# Altium footprint library 我的器件.PCBLIB: 450 footprints (part 14 of 29)
Each footprint in its own frame and in the unit in brackets; x right, y up, seen from the top. Pads: shape width x height; smd on the part's side, far side on the other; paste and mask are expansions set on the pad; w line width, h text height; cw(c..) or ccw(c..) is an arc to the next point about the centre after c.
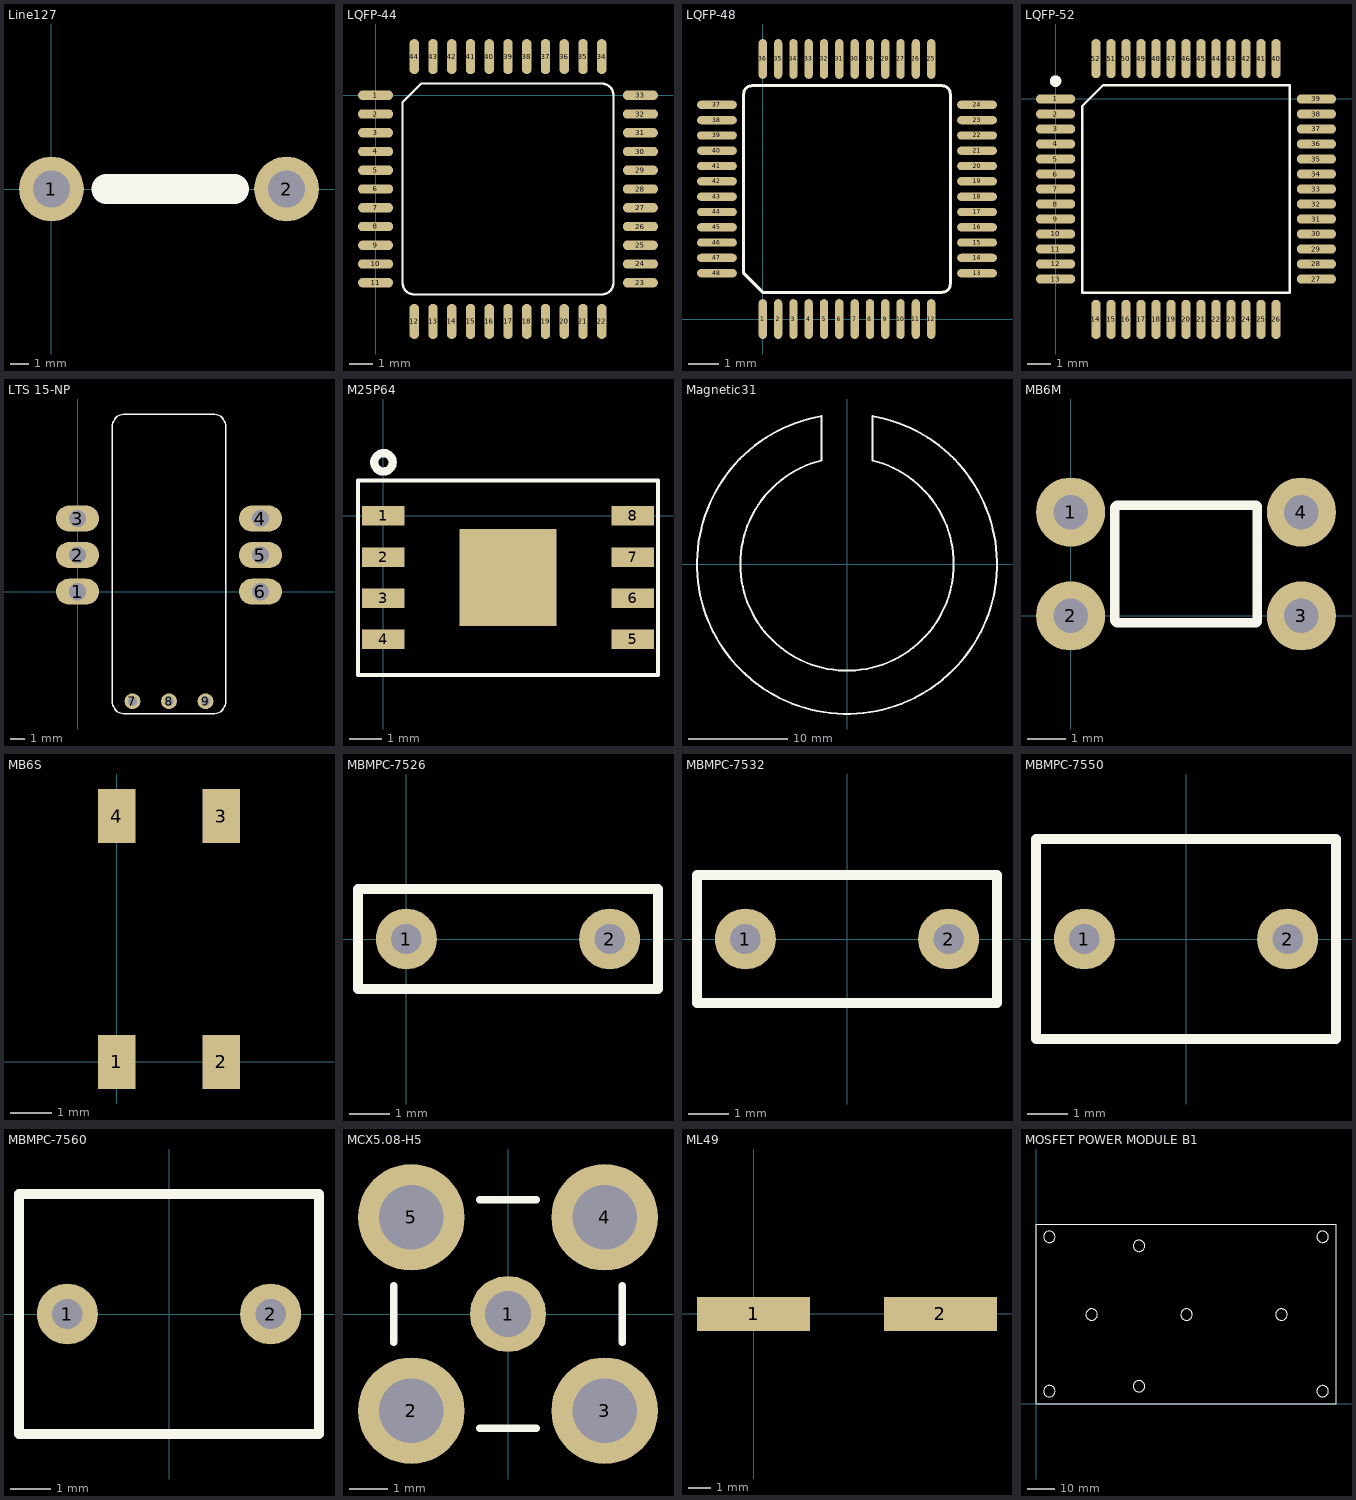
[diagram p13: the footprints below, top view; thin cyan lines are the x and y axes]

## Line127 [mm]
pads (2):
  round 3.5 hole 2: 1(0,0) 2(12.7,0)
Top Overlay:
  lines w1.6: 2.971,0 9.875,0

## LQFP-44 [mm] "Body 12mmX12mmX1.2mm"
height 1.2
pads (44):
  oval 1.5x0.4 smd: 1(0,0) 2(0,-0.8) 3(0,-1.6) 4(0,-2.4) 5(0,-3.2) 6(0,-4) 7(0,-4.8) 8(0,-5.6) 9(0,-6.4) 10(0,-7.2) 11(0,-8) 23(11.303,-8.001) 24(11.303,-7.201) 25(11.303,-6.401) 26(11.303,-5.601) 27(11.303,-4.801) 28(11.303,-4.001) 29(11.303,-3.201) 30(11.303,-2.401) 31(11.303,-1.601) 32(11.303,-0.801) 33(11.303,-0.001)
  oval 0.4x1.5 smd: 12(1.652,-9.652) 13(2.452,-9.652) 14(3.252,-9.652) 15(4.052,-9.652) 16(4.852,-9.652) 17(5.652,-9.652) 18(6.452,-9.652) 19(7.252,-9.652) 20(8.052,-9.652) 21(8.852,-9.652) 22(9.652,-9.652) 34(9.652,1.651) 35(8.852,1.651) 36(8.052,1.651) 37(7.252,1.651) 38(6.452,1.651) 39(5.652,1.651) 40(4.852,1.651) 41(4.052,1.651) 42(3.252,1.651) 43(2.452,1.651) 44(1.652,1.651)
Top Overlay:
  lines w0.1: 1.652,-8.501 9.651,-8.501 ccw(c9.651,-8.001) 10.152,-8.001 ; 1.652,-8.501 cw(c1.652,-8) 1.151,-8 1.151,-0.3 1.951,0.5 9.652,0.5 cw(c9.652,-0.001) 10.152,-0.001 10.152,-8
3D body: height 2.11, standoff 0.1, extent 1.5,-0.9 2.695,0.298
3D body: height 2, standoff 0.5, extent 0.749,-8.903 10.554,0.9
3D body: height 1.4, standoff 1.2, extent 1.464,0.902 1.841,1.156
3D body: height 1.4, standoff 0, extent 1.464,1.156 1.841,1.359
3D body: height 0.3, standoff 0, extent 1.464,1.359 1.841,2.045
3D body: height 0.3, standoff 0, extent 2.264,1.359 2.642,2.045
3D body: height 1.4, standoff 0, extent 2.264,1.156 2.642,1.359
3D body: height 1.4, standoff 1.2, extent 2.264,0.902 2.642,1.156
3D body: height 0.3, standoff 0, extent 3.064,1.359 3.442,2.045
3D body: height 1.4, standoff 0, extent 3.064,1.156 3.442,1.359
3D body: height 1.4, standoff 1.2, extent 3.064,0.902 3.442,1.156
3D body: height 0.3, standoff 0, extent 3.864,1.359 4.242,2.045
3D body: height 1.4, standoff 0, extent 3.864,1.156 4.242,1.359
3D body: height 1.4, standoff 1.2, extent 3.864,0.902 4.242,1.156
3D body: height 0.3, standoff 0, extent 4.664,1.359 5.042,2.045
3D body: height 1.4, standoff 0, extent 4.664,1.156 5.042,1.359
3D body: height 1.4, standoff 1.2, extent 4.664,0.902 5.042,1.156
3D body: height 0.3, standoff 0, extent 5.464,1.359 5.842,2.045
3D body: height 1.4, standoff 0, extent 5.464,1.156 5.842,1.359
3D body: height 1.4, standoff 1.2, extent 5.464,0.902 5.842,1.156
3D body: height 0.3, standoff 0, extent 6.264,1.359 6.642,2.045
3D body: height 1.4, standoff 0, extent 6.264,1.156 6.642,1.359
3D body: height 1.4, standoff 1.2, extent 6.264,0.902 6.642,1.156
3D body: height 0.3, standoff 0, extent 7.064,1.359 7.442,2.045
3D body: height 1.4, standoff 0, extent 7.064,1.156 7.442,1.359
3D body: height 1.4, standoff 1.2, extent 7.064,0.902 7.442,1.156
3D body: height 0.3, standoff 0, extent 7.876,1.372 8.254,2.057
3D body: height 1.4, standoff 0, extent 7.876,1.168 8.254,1.372
3D body: height 1.4, standoff 1.2, extent 7.876,0.914 8.254,1.168
3D body: height 0.3, standoff 0, extent 8.664,1.359 9.042,2.045
3D body: height 1.4, standoff 0, extent 8.664,1.156 9.042,1.359
3D body: height 1.4, standoff 1.2, extent 8.664,0.902 9.042,1.156
3D body: height 0.3, standoff 0, extent 9.464,1.359 9.842,2.045
3D body: height 1.4, standoff 0, extent 9.464,1.156 9.842,1.359
3D body: height 1.4, standoff 1.2, extent 9.464,0.902 9.842,1.156
3D body: height 0.3, standoff 0, extent 11.011,-0.191 11.697,0.187
3D body: height 1.4, standoff 0, extent 10.808,-0.191 11.011,0.187
3D body: height 1.4, standoff 1.2, extent 10.554,-0.191 10.808,0.187
3D body: height 0.3, standoff 0, extent 11.011,-0.991 11.697,-0.613
3D body: height 1.4, standoff 0, extent 10.808,-0.991 11.011,-0.613
3D body: height 1.4, standoff 1.2, extent 10.554,-0.991 10.808,-0.613
3D body: height 0.3, standoff 0, extent 11.011,-1.791 11.697,-1.413
3D body: height 1.4, standoff 0, extent 10.808,-1.791 11.011,-1.413
3D body: height 1.4, standoff 1.2, extent 10.554,-1.791 10.808,-1.413
3D body: height 0.3, standoff 0, extent 11.011,-2.591 11.697,-2.213
3D body: height 1.4, standoff 0, extent 10.808,-2.591 11.011,-2.213
3D body: height 1.4, standoff 1.2, extent 10.554,-2.591 10.808,-2.213
3D body: height 0.3, standoff 0, extent 11.011,-3.391 11.697,-3.013
3D body: height 1.4, standoff 0, extent 10.808,-3.391 11.011,-3.013
3D body: height 1.4, standoff 1.2, extent 10.554,-3.391 10.808,-3.013
3D body: height 0.3, standoff 0, extent 11.011,-4.191 11.697,-3.813
3D body: height 1.4, standoff 0, extent 10.808,-4.191 11.011,-3.813
3D body: height 1.4, standoff 1.2, extent 10.554,-4.191 10.808,-3.813
3D body: height 0.3, standoff 0, extent 11.011,-4.991 11.697,-4.613
3D body: height 1.4, standoff 0, extent 10.808,-4.991 11.011,-4.613
3D body: height 1.4, standoff 1.2, extent 10.554,-4.991 10.808,-4.613
3D body: height 0.3, standoff 0, extent 11.011,-5.791 11.697,-5.413
3D body: height 1.4, standoff 0, extent 10.808,-5.791 11.011,-5.413
3D body: height 1.4, standoff 1.2, extent 10.554,-5.791 10.808,-5.413
3D body: height 0.3, standoff 0, extent 11.011,-6.591 11.697,-6.213
3D body: height 1.4, standoff 0, extent 10.808,-6.591 11.011,-6.213
3D body: height 1.4, standoff 1.2, extent 10.554,-6.591 10.808,-6.213
3D body: height 0.3, standoff 0, extent 11.011,-7.391 11.697,-7.013
3D body: height 1.4, standoff 0, extent 10.808,-7.391 11.011,-7.013
3D body: height 1.4, standoff 1.2, extent 10.554,-7.391 10.808,-7.013
3D body: height 0.3, standoff 0, extent 11.011,-8.191 11.697,-7.813
3D body: height 1.4, standoff 0, extent 10.808,-8.191 11.011,-7.813
3D body: height 1.4, standoff 1.2, extent 10.554,-8.191 10.808,-7.813
3D body: height 0.3, standoff 0, extent 9.462,-10.046 9.84,-9.36
3D body: height 1.4, standoff 0, extent 9.462,-9.36 9.84,-9.157
3D body: height 1.4, standoff 1.2, extent 9.462,-9.157 9.84,-8.903
3D body: height 0.3, standoff 0, extent 8.662,-10.046 9.04,-9.36
3D body: height 1.4, standoff 0, extent 8.662,-9.36 9.04,-9.157
3D body: height 1.4, standoff 1.2, extent 8.662,-9.157 9.04,-8.903
3D body: height 0.3, standoff 0, extent 7.862,-10.046 8.24,-9.36
3D body: height 1.4, standoff 0, extent 7.862,-9.36 8.24,-9.157
3D body: height 1.4, standoff 1.2, extent 7.862,-9.157 8.24,-8.903
3D body: height 0.3, standoff 0, extent 7.062,-10.046 7.44,-9.36
3D body: height 1.4, standoff 0, extent 7.062,-9.36 7.44,-9.157
3D body: height 1.4, standoff 1.2, extent 7.062,-9.157 7.44,-8.903
3D body: height 0.3, standoff 0, extent 6.262,-10.046 6.64,-9.36
3D body: height 1.4, standoff 0, extent 6.262,-9.36 6.64,-9.157
3D body: height 1.4, standoff 1.2, extent 6.262,-9.157 6.64,-8.903
3D body: height 0.3, standoff 0, extent 5.462,-10.046 5.84,-9.36
3D body: height 1.4, standoff 0, extent 5.462,-9.36 5.84,-9.157
3D body: height 1.4, standoff 1.2, extent 5.462,-9.157 5.84,-8.903
3D body: height 0.3, standoff 0, extent 4.662,-10.046 5.04,-9.36
3D body: height 1.4, standoff 0, extent 4.662,-9.36 5.04,-9.157
3D body: height 1.4, standoff 1.2, extent 4.662,-9.157 5.04,-8.903
3D body: height 0.3, standoff 0, extent 3.862,-10.046 4.24,-9.36
3D body: height 1.4, standoff 0, extent 3.862,-9.36 4.24,-9.157
3D body: height 1.4, standoff 1.2, extent 3.862,-9.157 4.24,-8.903
3D body: height 0.3, standoff 0, extent 3.062,-10.046 3.44,-9.36
3D body: height 1.4, standoff 0, extent 3.062,-9.36 3.44,-9.157
3D body: height 1.4, standoff 1.2, extent 3.062,-9.157 3.44,-8.903
3D body: height 0.3, standoff 0, extent 2.262,-10.046 2.64,-9.36
3D body: height 1.4, standoff 0, extent 2.262,-9.36 2.64,-9.157
3D body: height 1.4, standoff 1.2, extent 2.262,-9.157 2.64,-8.903
3D body: height 0.3, standoff 0, extent 1.462,-10.046 1.84,-9.36
3D body: height 1.4, standoff 0, extent 1.462,-9.36 1.84,-9.157
3D body: height 1.4, standoff 1.2, extent 1.462,-9.157 1.84,-8.903
3D body: height 0.3, standoff 0, extent -0.394,-8.188 0.292,-7.81
3D body: height 1.4, standoff 0, extent 0.292,-8.188 0.495,-7.81
3D body: height 1.4, standoff 1.2, extent 0.495,-8.188 0.749,-7.81
3D body: height 0.3, standoff 0, extent -0.394,-7.388 0.292,-7.01
3D body: height 1.4, standoff 0, extent 0.292,-7.388 0.495,-7.01
3D body: height 1.4, standoff 1.2, extent 0.495,-7.388 0.749,-7.01
3D body: height 0.3, standoff 0, extent -0.394,-6.588 0.292,-6.21
3D body: height 1.4, standoff 0, extent 0.292,-6.588 0.495,-6.21
3D body: height 1.4, standoff 1.2, extent 0.495,-6.588 0.749,-6.21
3D body: height 0.3, standoff 0, extent -0.394,-5.788 0.292,-5.41
3D body: height 1.4, standoff 0, extent 0.292,-5.788 0.495,-5.41
3D body: height 1.4, standoff 1.2, extent 0.495,-5.788 0.749,-5.41
3D body: height 0.3, standoff 0, extent -0.394,-4.988 0.292,-4.61
3D body: height 1.4, standoff 0, extent 0.292,-4.988 0.495,-4.61
3D body: height 1.4, standoff 1.2, extent 0.495,-4.988 0.749,-4.61
3D body: height 0.3, standoff 0, extent -0.394,-4.188 0.292,-3.81
3D body: height 1.4, standoff 0, extent 0.292,-4.188 0.495,-3.81
3D body: height 1.4, standoff 1.2, extent 0.495,-4.188 0.749,-3.81
3D body: height 0.3, standoff 0, extent -0.394,-3.388 0.292,-3.01
3D body: height 1.4, standoff 0, extent 0.292,-3.388 0.495,-3.01
3D body: height 1.4, standoff 1.2, extent 0.495,-3.388 0.749,-3.01
3D body: height 0.3, standoff 0, extent -0.394,-2.588 0.292,-2.21
3D body: height 1.4, standoff 0, extent 0.292,-2.588 0.495,-2.21
3D body: height 1.4, standoff 1.2, extent 0.495,-2.588 0.749,-2.21
3D body: height 0.3, standoff 0, extent -0.394,-1.788 0.292,-1.41
3D body: height 1.4, standoff 0, extent 0.292,-1.788 0.495,-1.41
3D body: height 1.4, standoff 1.2, extent 0.495,-1.788 0.749,-1.41
3D body: height 0.3, standoff 0, extent -0.394,-0.988 0.292,-0.61
3D body: height 1.4, standoff 0, extent 0.292,-0.988 0.495,-0.61
3D body: height 1.4, standoff 1.2, extent 0.495,-0.988 0.749,-0.61
3D body: height 0.3, standoff 0, extent -0.394,-0.188 0.292,0.19
3D body: height 1.4, standoff 0, extent 0.292,-0.188 0.495,0.19
3D body: height 1.4, standoff 1.2, extent 0.495,-0.188 0.749,0.19

## LQFP-48 [mm] "distance 0.5mm"
pads (48):
  oval 0.27x1.3 smd: 1(0,0) 2(0.5,0) 3(1,0) 4(1.5,0) 5(2,0) 6(2.5,0) 7(3,0) 8(3.5,0) 9(4,0) 10(4.5,0) 11(5,0) 12(5.5,0) 25(5.5,8.5) 26(5,8.5) 27(4.5,8.5) 28(4,8.5) 29(3.5,8.5) 30(3,8.5) 31(2.5,8.5) 32(2,8.5) 33(1.5,8.5) 34(1,8.5) 35(0.5,8.5) 36(0,8.5)
  oval 1.3x0.27 smd: 13(7,1.5) 14(7,2) 15(7,2.5) 16(7,3) 17(7,3.5) 18(7,4) 19(7,4.5) 20(7,5) 21(7,5.5) 22(7,6) 23(7,6.5) 24(7,7) 37(-1.5,7) 38(-1.5,6.5) 39(-1.5,6) 40(-1.5,5.5) 41(-1.5,5) 42(-1.5,4.5) 43(-1.5,4) 44(-1.5,3.5) 45(-1.5,3) 46(-1.5,2.5) 47(-1.5,2) 48(-1.5,1.5)
Top Overlay:
  lines w0.1: -0.625,1.5 -0.625,7.35 cw(c-0.35,7.35) -0.35,7.625 5.85,7.625 cw(c5.85,7.35) 6.125,7.35 6.125,1.15 cw(c5.85,1.15) 5.85,0.875 0,0.875 -0.625,1.5
3D body: height 1, standoff 0.8, extent -0.127,0.406 0.127,0.66
3D body: height 1, standoff 0, extent -0.127,0.203 0.127,0.406
3D body: height 0.3, standoff 0, extent -0.127,-0.483 0.127,0.203
3D body: height 1.6, standoff 0.1, extent -0.857,0.643 6.382,7.857
3D body: height 1.61, standoff 1.6, extent -0.3,1.2 0.3,1.8
3D body: height 0.3, standoff 0, extent 0.373,-0.483 0.627,0.203
3D body: height 1, standoff 0, extent 0.373,0.203 0.627,0.406
3D body: height 1, standoff 0.8, extent 0.373,0.406 0.627,0.66
3D body: height 0.3, standoff 0, extent 0.873,-0.483 1.127,0.203
3D body: height 1, standoff 0, extent 0.873,0.203 1.127,0.406
3D body: height 1, standoff 0.8, extent 0.873,0.406 1.127,0.66
3D body: height 0.3, standoff 0, extent 1.373,-0.483 1.627,0.203
3D body: height 1, standoff 0, extent 1.373,0.203 1.627,0.406
3D body: height 1, standoff 0.8, extent 1.373,0.406 1.627,0.66
3D body: height 0.3, standoff 0, extent 1.873,-0.483 2.127,0.203
3D body: height 1, standoff 0, extent 1.873,0.203 2.127,0.406
3D body: height 1, standoff 0.8, extent 1.873,0.406 2.127,0.66
3D body: height 0.3, standoff 0, extent 2.373,-0.483 2.627,0.203
3D body: height 1, standoff 0, extent 2.373,0.203 2.627,0.406
3D body: height 1, standoff 0.8, extent 2.373,0.406 2.627,0.66
3D body: height 0.3, standoff 0, extent 2.873,-0.483 3.127,0.203
3D body: height 1, standoff 0, extent 2.873,0.203 3.127,0.406
3D body: height 1, standoff 0.8, extent 2.873,0.406 3.127,0.66
3D body: height 0.3, standoff 0, extent 3.373,-0.483 3.627,0.203
3D body: height 1, standoff 0, extent 3.373,0.203 3.627,0.406
3D body: height 1, standoff 0.8, extent 3.373,0.406 3.627,0.66
3D body: height 0.3, standoff 0, extent 3.873,-0.483 4.127,0.203
3D body: height 1, standoff 0, extent 3.873,0.203 4.127,0.406
3D body: height 1, standoff 0.8, extent 3.873,0.406 4.127,0.66
3D body: height 0.3, standoff 0, extent 4.373,-0.483 4.627,0.203
3D body: height 1, standoff 0, extent 4.373,0.203 4.627,0.406
3D body: height 1, standoff 0.8, extent 4.373,0.406 4.627,0.66
3D body: height 0.3, standoff 0, extent 4.873,-0.483 5.127,0.203
3D body: height 1, standoff 0, extent 4.873,0.203 5.127,0.406
3D body: height 1, standoff 0.8, extent 4.873,0.406 5.127,0.66
3D body: height 0.3, standoff 0, extent 5.373,-0.483 5.627,0.203
3D body: height 1, standoff 0, extent 5.373,0.203 5.627,0.406
3D body: height 1, standoff 0.8, extent 5.373,0.406 5.627,0.66
3D body: height 1, standoff 0.8, extent 6.34,6.873 6.594,7.127
3D body: height 1, standoff 0, extent 6.594,6.873 6.797,7.127
3D body: height 0.3, standoff 0, extent 6.797,6.873 7.483,7.127
3D body: height 1, standoff 0.8, extent 6.34,6.373 6.594,6.627
3D body: height 1, standoff 0, extent 6.594,6.373 6.797,6.627
3D body: height 0.3, standoff 0, extent 6.797,6.373 7.483,6.627
3D body: height 1, standoff 0.8, extent 6.34,5.873 6.594,6.127
3D body: height 1, standoff 0, extent 6.594,5.873 6.797,6.127
3D body: height 0.3, standoff 0, extent 6.797,5.873 7.483,6.127
3D body: height 1, standoff 0.8, extent 6.34,5.373 6.594,5.627
3D body: height 1, standoff 0, extent 6.594,5.373 6.797,5.627
3D body: height 0.3, standoff 0, extent 6.797,5.373 7.483,5.627
3D body: height 1, standoff 0.8, extent 6.34,4.873 6.594,5.127
3D body: height 1, standoff 0, extent 6.594,4.873 6.797,5.127
3D body: height 0.3, standoff 0, extent 6.797,4.873 7.483,5.127
3D body: height 1, standoff 0.8, extent 6.34,4.373 6.594,4.627
3D body: height 1, standoff 0, extent 6.594,4.373 6.797,4.627
3D body: height 0.3, standoff 0, extent 6.797,4.373 7.483,4.627
3D body: height 1, standoff 0.8, extent 6.34,3.873 6.594,4.127
3D body: height 1, standoff 0, extent 6.594,3.873 6.797,4.127
3D body: height 0.3, standoff 0, extent 6.797,3.873 7.483,4.127
3D body: height 1, standoff 0.8, extent 6.34,3.373 6.594,3.627
3D body: height 1, standoff 0, extent 6.594,3.373 6.797,3.627
3D body: height 0.3, standoff 0, extent 6.797,3.373 7.483,3.627
3D body: height 1, standoff 0.8, extent 6.34,2.873 6.594,3.127
3D body: height 1, standoff 0, extent 6.594,2.873 6.797,3.127
3D body: height 0.3, standoff 0, extent 6.797,2.873 7.483,3.127
3D body: height 1, standoff 0.8, extent 6.34,2.373 6.594,2.627
3D body: height 1, standoff 0, extent 6.594,2.373 6.797,2.627
3D body: height 0.3, standoff 0, extent 6.797,2.373 7.483,2.627
3D body: height 1, standoff 0.8, extent 6.34,1.873 6.594,2.127
3D body: height 1, standoff 0, extent 6.594,1.873 6.797,2.127
3D body: height 0.3, standoff 0, extent 6.797,1.873 7.483,2.127
3D body: height 0.3, standoff 0, extent 6.797,1.373 7.483,1.627
3D body: height 1, standoff 0, extent 6.594,1.373 6.797,1.627
3D body: height 1, standoff 0.8, extent 6.34,1.373 6.594,1.627
3D body: height 1, standoff 0.8, extent -0.127,7.84 0.127,8.094
3D body: height 1, standoff 0, extent -0.127,8.094 0.127,8.297
3D body: height 0.3, standoff 0, extent -0.127,8.297 0.127,8.983
3D body: height 1, standoff 0.8, extent 0.373,7.84 0.627,8.094
3D body: height 1, standoff 0, extent 0.373,8.094 0.627,8.297
3D body: height 0.3, standoff 0, extent 0.373,8.297 0.627,8.983
3D body: height 1, standoff 0.8, extent 0.873,7.84 1.127,8.094
3D body: height 1, standoff 0, extent 0.873,8.094 1.127,8.297
3D body: height 0.3, standoff 0, extent 0.873,8.297 1.127,8.983
3D body: height 1, standoff 0.8, extent 1.373,7.84 1.627,8.094
3D body: height 1, standoff 0, extent 1.373,8.094 1.627,8.297
3D body: height 0.3, standoff 0, extent 1.373,8.297 1.627,8.983
3D body: height 1, standoff 0.8, extent 1.873,7.84 2.127,8.094
3D body: height 1, standoff 0, extent 1.873,8.094 2.127,8.297
3D body: height 0.3, standoff 0, extent 1.873,8.297 2.127,8.983
3D body: height 1, standoff 0.8, extent 2.373,7.84 2.627,8.094
3D body: height 1, standoff 0, extent 2.373,8.094 2.627,8.297
3D body: height 0.3, standoff 0, extent 2.373,8.297 2.627,8.983
3D body: height 1, standoff 0.8, extent 2.873,7.84 3.127,8.094
3D body: height 1, standoff 0, extent 2.873,8.094 3.127,8.297
3D body: height 0.3, standoff 0, extent 2.873,8.297 3.127,8.983
3D body: height 1, standoff 0.8, extent 3.373,7.84 3.627,8.094
3D body: height 1, standoff 0, extent 3.373,8.094 3.627,8.297
3D body: height 0.3, standoff 0, extent 3.373,8.297 3.627,8.983
3D body: height 1, standoff 0.8, extent 3.873,7.84 4.127,8.094
3D body: height 1, standoff 0, extent 3.873,8.094 4.127,8.297
3D body: height 0.3, standoff 0, extent 3.873,8.297 4.127,8.983
3D body: height 1, standoff 0.8, extent 4.373,7.84 4.627,8.094
3D body: height 1, standoff 0, extent 4.373,8.094 4.627,8.297
3D body: height 0.3, standoff 0, extent 4.373,8.297 4.627,8.983
3D body: height 1, standoff 0.8, extent 4.873,7.84 5.127,8.094
3D body: height 1, standoff 0, extent 4.873,8.094 5.127,8.297
3D body: height 0.3, standoff 0, extent 4.873,8.297 5.127,8.983
3D body: height 0.3, standoff 0, extent 5.373,8.297 5.627,8.983
3D body: height 1, standoff 0, extent 5.373,8.094 5.627,8.297
3D body: height 1, standoff 0.8, extent 5.373,7.84 5.627,8.094
3D body: height 1, standoff 0.8, extent -1.094,1.373 -0.84,1.627
3D body: height 1, standoff 0, extent -1.297,1.373 -1.094,1.627
3D body: height 0.3, standoff 0, extent -1.983,1.373 -1.297,1.627
3D body: height 1, standoff 0.8, extent -1.094,1.873 -0.84,2.127
3D body: height 1, standoff 0, extent -1.297,1.873 -1.094,2.127
3D body: height 0.3, standoff 0, extent -1.983,1.873 -1.297,2.127
3D body: height 1, standoff 0.8, extent -1.094,2.373 -0.84,2.627
3D body: height 1, standoff 0, extent -1.297,2.373 -1.094,2.627
3D body: height 0.3, standoff 0, extent -1.983,2.373 -1.297,2.627
3D body: height 1, standoff 0.8, extent -1.094,2.873 -0.84,3.127
3D body: height 1, standoff 0, extent -1.297,2.873 -1.094,3.127
3D body: height 0.3, standoff 0, extent -1.983,2.873 -1.297,3.127
3D body: height 1, standoff 0.8, extent -1.094,3.373 -0.84,3.627
3D body: height 1, standoff 0, extent -1.297,3.373 -1.094,3.627
3D body: height 0.3, standoff 0, extent -1.983,3.373 -1.297,3.627
3D body: height 1, standoff 0.8, extent -1.094,3.873 -0.84,4.127
3D body: height 1, standoff 0, extent -1.297,3.873 -1.094,4.127
3D body: height 0.3, standoff 0, extent -1.983,3.873 -1.297,4.127
3D body: height 1, standoff 0.8, extent -1.094,4.373 -0.84,4.627
3D body: height 1, standoff 0, extent -1.297,4.373 -1.094,4.627
3D body: height 0.3, standoff 0, extent -1.983,4.373 -1.297,4.627
3D body: height 1, standoff 0.8, extent -1.094,4.873 -0.84,5.127
3D body: height 1, standoff 0, extent -1.297,4.873 -1.094,5.127
3D body: height 0.3, standoff 0, extent -1.983,4.873 -1.297,5.127
3D body: height 1, standoff 0.8, extent -1.094,5.373 -0.84,5.627
3D body: height 1, standoff 0, extent -1.297,5.373 -1.094,5.627
3D body: height 0.3, standoff 0, extent -1.983,5.373 -1.297,5.627
3D body: height 1, standoff 0.8, extent -1.094,5.873 -0.84,6.127
3D body: height 1, standoff 0, extent -1.297,5.873 -1.094,6.127
3D body: height 0.3, standoff 0, extent -1.983,5.873 -1.297,6.127
3D body: height 1, standoff 0.8, extent -1.094,6.373 -0.84,6.627
3D body: height 1, standoff 0, extent -1.297,6.373 -1.094,6.627
3D body: height 0.3, standoff 0, extent -1.983,6.373 -1.297,6.627
3D body: height 0.3, standoff 0, extent -1.983,6.873 -1.297,7.127
3D body: height 1, standoff 0, extent -1.297,6.873 -1.094,7.127
3D body: height 1, standoff 0.8, extent -1.094,6.873 -0.84,7.127

## LQFP-52 [mm]
pads (52):
  oval 1.7x0.4 smd: 1(0,0) 2(0,-0.65) 3(0,-1.3) 4(0,-1.95) 5(0,-2.6) 6(0,-3.25) 7(0,-3.9) 8(0,-4.55) 9(0,-5.2) 10(0,-5.85) 11(0,-6.5) 12(0,-7.15) 13(0,-7.8) 27(11.3,-7.8) 28(11.3,-7.15) 29(11.3,-6.5) 30(11.3,-5.85) 31(11.3,-5.2) 32(11.3,-4.55) 33(11.3,-3.9) 34(11.3,-3.25) 35(11.3,-2.6) 36(11.3,-1.95) 37(11.3,-1.3) 38(11.3,-0.65) 39(11.3,0)
  oval 0.4x1.7 smd: 14(1.75,-9.55) 15(2.4,-9.55) 16(3.05,-9.55) 17(3.7,-9.55) 18(4.35,-9.55) 19(5,-9.55) 20(5.65,-9.55) 21(6.3,-9.55) 22(6.95,-9.55) 23(7.6,-9.55) 24(8.25,-9.55) 25(8.9,-9.55) 26(9.55,-9.55) 40(9.55,1.75) 41(8.9,1.75) 42(8.25,1.75) 43(7.6,1.75) 44(6.95,1.75) 45(6.3,1.75) 46(5.65,1.75) 47(5,1.75) 48(4.35,1.75) 49(3.7,1.75) 50(3.05,1.75) 51(2.4,1.75) 52(1.75,1.75)
Top Overlay:
  circle w0.25: c0,0.775 r0.125
  lines w0.1: 1.15,-8.4 1.15,-0.4 1.15,-0.3 2.05,0.6 10.15,0.6 10.15,-8.4 1.15,-8.4
3D body: height 0.2, standoff 0, extent -0.494,-1.488 0.192,-1.11
3D body: height 0.7, standoff 0, extent 0.192,-1.488 0.395,-1.11
3D body: height 0.7, standoff 0.5, extent 0.395,-1.488 0.649,-1.11
3D body: height 0.2, standoff 0, extent -0.494,-0.838 0.192,-0.46
3D body: height 0.7, standoff 0, extent 0.192,-0.838 0.395,-0.46
3D body: height 0.7, standoff 0.5, extent 0.395,-0.838 0.649,-0.46
3D body: height 1.31, standoff 0.1, extent 1.5,-0.9 2.695,0.298
3D body: height 0.7, standoff 0.5, extent 0.395,-0.188 0.649,0.19
3D body: height 0.7, standoff 0, extent 0.192,-0.188 0.395,0.19
3D body: height 0.2, standoff 0, extent -0.494,-0.188 0.192,0.19
3D body: height 0.7, standoff 0.5, extent 0.395,-2.138 0.649,-1.76
3D body: height 0.7, standoff 0, extent 0.192,-2.138 0.395,-1.76
3D body: height 0.2, standoff 0, extent -0.494,-2.138 0.192,-1.76
3D body: height 0.7, standoff 0.5, extent 0.395,-2.788 0.649,-2.41
3D body: height 0.7, standoff 0, extent 0.192,-2.788 0.395,-2.41
3D body: height 0.2, standoff 0, extent -0.494,-2.788 0.192,-2.41
3D body: height 0.7, standoff 0.5, extent 0.395,-3.438 0.649,-3.06
3D body: height 0.7, standoff 0, extent 0.192,-3.438 0.395,-3.06
3D body: height 0.2, standoff 0, extent -0.494,-3.438 0.192,-3.06
3D body: height 0.7, standoff 0.5, extent 0.395,-4.088 0.649,-3.71
3D body: height 0.7, standoff 0, extent 0.192,-4.088 0.395,-3.71
3D body: height 0.2, standoff 0, extent -0.494,-4.088 0.192,-3.71
3D body: height 0.7, standoff 0.5, extent 0.395,-4.738 0.649,-4.36
3D body: height 0.7, standoff 0, extent 0.192,-4.738 0.395,-4.36
3D body: height 0.2, standoff 0, extent -0.494,-4.738 0.192,-4.36
3D body: height 0.7, standoff 0.5, extent 0.395,-5.388 0.649,-5.01
3D body: height 0.7, standoff 0, extent 0.192,-5.388 0.395,-5.01
3D body: height 0.2, standoff 0, extent -0.494,-5.388 0.192,-5.01
3D body: height 0.7, standoff 0.5, extent 0.395,-6.038 0.649,-5.66
3D body: height 0.7, standoff 0, extent 0.192,-6.038 0.395,-5.66
3D body: height 0.2, standoff 0, extent -0.494,-6.038 0.192,-5.66
3D body: height 0.7, standoff 0.5, extent 0.395,-6.688 0.649,-6.31
3D body: height 0.7, standoff 0, extent 0.192,-6.688 0.395,-6.31
3D body: height 0.2, standoff 0, extent -0.494,-6.688 0.192,-6.31
3D body: height 0.7, standoff 0.5, extent 0.395,-7.338 0.649,-6.96
3D body: height 0.7, standoff 0, extent 0.192,-7.338 0.395,-6.96
3D body: height 0.2, standoff 0, extent -0.494,-7.338 0.192,-6.96
3D body: height 0.7, standoff 0.5, extent 0.395,-7.988 0.649,-7.61
3D body: height 0.7, standoff 0, extent 0.192,-7.988 0.395,-7.61
3D body: height 0.2, standoff 0, extent -0.494,-7.988 0.192,-7.61
3D body: height 0.7, standoff 0.5, extent 1.56,-9.155 1.938,-8.901
3D body: height 0.7, standoff 0, extent 1.56,-9.358 1.938,-9.155
3D body: height 0.2, standoff 0, extent 1.56,-10.044 1.938,-9.358
3D body: height 0.7, standoff 0.5, extent 2.21,-9.155 2.588,-8.901
3D body: height 0.7, standoff 0, extent 2.21,-9.358 2.588,-9.155
3D body: height 0.2, standoff 0, extent 2.21,-10.044 2.588,-9.358
3D body: height 0.7, standoff 0.5, extent 2.86,-9.155 3.238,-8.901
3D body: height 0.7, standoff 0, extent 2.86,-9.358 3.238,-9.155
3D body: height 0.2, standoff 0, extent 2.86,-10.044 3.238,-9.358
3D body: height 0.7, standoff 0.5, extent 3.51,-9.155 3.888,-8.901
3D body: height 0.7, standoff 0, extent 3.51,-9.358 3.888,-9.155
3D body: height 0.2, standoff 0, extent 3.51,-10.044 3.888,-9.358
3D body: height 0.7, standoff 0.5, extent 4.16,-9.155 4.538,-8.901
3D body: height 0.7, standoff 0, extent 4.16,-9.358 4.538,-9.155
3D body: height 0.2, standoff 0, extent 4.16,-10.044 4.538,-9.358
3D body: height 0.7, standoff 0.5, extent 4.81,-9.155 5.188,-8.901
3D body: height 0.7, standoff 0, extent 4.81,-9.358 5.188,-9.155
3D body: height 0.2, standoff 0, extent 4.81,-10.044 5.188,-9.358
3D body: height 0.7, standoff 0.5, extent 5.46,-9.155 5.838,-8.901
3D body: height 0.7, standoff 0, extent 5.46,-9.358 5.838,-9.155
3D body: height 0.2, standoff 0, extent 5.46,-10.044 5.838,-9.358
3D body: height 0.7, standoff 0.5, extent 6.11,-9.155 6.488,-8.901
3D body: height 0.7, standoff 0, extent 6.11,-9.358 6.488,-9.155
3D body: height 0.2, standoff 0, extent 6.11,-10.044 6.488,-9.358
3D body: height 0.7, standoff 0.5, extent 6.76,-9.155 7.138,-8.901
3D body: height 0.7, standoff 0, extent 6.76,-9.358 7.138,-9.155
3D body: height 0.2, standoff 0, extent 6.76,-10.044 7.138,-9.358
3D body: height 0.7, standoff 0.5, extent 7.41,-9.155 7.788,-8.901
3D body: height 0.7, standoff 0, extent 7.41,-9.358 7.788,-9.155
3D body: height 0.2, standoff 0, extent 7.41,-10.044 7.788,-9.358
3D body: height 0.7, standoff 0.5, extent 8.06,-9.155 8.438,-8.901
3D body: height 0.7, standoff 0, extent 8.06,-9.358 8.438,-9.155
3D body: height 0.2, standoff 0, extent 8.06,-10.044 8.438,-9.358
3D body: height 0.7, standoff 0.5, extent 8.71,-9.155 9.088,-8.901
3D body: height 0.7, standoff 0, extent 8.71,-9.358 9.088,-9.155
3D body: height 0.2, standoff 0, extent 8.71,-10.044 9.088,-9.358
3D body: height 0.7, standoff 0.5, extent 9.36,-9.155 9.738,-8.901
3D body: height 0.7, standoff 0, extent 9.36,-9.358 9.738,-9.155
3D body: height 0.2, standoff 0, extent 9.36,-10.044 9.738,-9.358
3D body: height 0.7, standoff 0.5, extent 10.651,-7.99 10.905,-7.612
3D body: height 0.7, standoff 0, extent 10.905,-7.99 11.108,-7.612
3D body: height 0.2, standoff 0, extent 11.108,-7.99 11.794,-7.612
3D body: height 0.7, standoff 0.5, extent 10.651,-7.34 10.905,-6.962
3D body: height 0.7, standoff 0, extent 10.905,-7.34 11.108,-6.962
3D body: height 0.2, standoff 0, extent 11.108,-7.34 11.794,-6.962
3D body: height 0.7, standoff 0.5, extent 10.651,-6.69 10.905,-6.312
3D body: height 0.7, standoff 0, extent 10.905,-6.69 11.108,-6.312
3D body: height 0.2, standoff 0, extent 11.108,-6.69 11.794,-6.312
3D body: height 0.7, standoff 0.5, extent 10.651,-6.04 10.905,-5.662
3D body: height 0.7, standoff 0, extent 10.905,-6.04 11.108,-5.662
3D body: height 0.2, standoff 0, extent 11.108,-6.04 11.794,-5.662
3D body: height 0.7, standoff 0.5, extent 10.651,-5.39 10.905,-5.012
3D body: height 0.7, standoff 0, extent 10.905,-5.39 11.108,-5.012
3D body: height 0.2, standoff 0, extent 11.108,-5.39 11.794,-5.012
3D body: height 0.7, standoff 0.5, extent 10.651,-4.74 10.905,-4.362
3D body: height 0.7, standoff 0, extent 10.905,-4.74 11.108,-4.362
3D body: height 0.2, standoff 0, extent 11.108,-4.74 11.794,-4.362
3D body: height 0.7, standoff 0.5, extent 10.651,-4.09 10.905,-3.712
3D body: height 0.7, standoff 0, extent 10.905,-4.09 11.108,-3.712
3D body: height 0.2, standoff 0, extent 11.108,-4.09 11.794,-3.712
3D body: height 0.7, standoff 0.5, extent 10.651,-3.44 10.905,-3.062
3D body: height 0.7, standoff 0, extent 10.905,-3.44 11.108,-3.062
3D body: height 0.2, standoff 0, extent 11.108,-3.44 11.794,-3.062
3D body: height 0.7, standoff 0.5, extent 10.651,-2.79 10.905,-2.412
3D body: height 0.7, standoff 0, extent 10.905,-2.79 11.108,-2.412
3D body: height 0.2, standoff 0, extent 11.108,-2.79 11.794,-2.412
3D body: height 0.7, standoff 0.5, extent 10.651,-2.14 10.905,-1.762
3D body: height 0.7, standoff 0, extent 10.905,-2.14 11.108,-1.762
3D body: height 0.2, standoff 0, extent 11.108,-2.14 11.794,-1.762
3D body: height 0.7, standoff 0.5, extent 10.651,-1.49 10.905,-1.112
3D body: height 0.7, standoff 0, extent 10.905,-1.49 11.108,-1.112
3D body: height 0.2, standoff 0, extent 11.108,-1.49 11.794,-1.112
3D body: height 0.7, standoff 0.5, extent 10.651,-0.84 10.905,-0.462
3D body: height 0.7, standoff 0, extent 10.905,-0.84 11.108,-0.462
3D body: height 0.2, standoff 0, extent 11.108,-0.84 11.794,-0.462
3D body: height 0.7, standoff 0.5, extent 10.651,-0.19 10.905,0.188
3D body: height 0.7, standoff 0, extent 10.905,-0.19 11.108,0.188
3D body: height 0.2, standoff 0, extent 11.108,-0.19 11.794,0.188
3D body: height 0.7, standoff 0.5, extent 9.362,1.101 9.74,1.355
3D body: height 0.7, standoff 0, extent 9.362,1.355 9.74,1.558
3D body: height 0.2, standoff 0, extent 9.362,1.558 9.74,2.244
3D body: height 0.7, standoff 0.5, extent 8.712,1.101 9.09,1.355
3D body: height 0.7, standoff 0, extent 8.712,1.355 9.09,1.558
3D body: height 0.2, standoff 0, extent 8.712,1.558 9.09,2.244
3D body: height 0.7, standoff 0.5, extent 8.062,1.101 8.44,1.355
3D body: height 0.7, standoff 0, extent 8.062,1.355 8.44,1.558
3D body: height 0.2, standoff 0, extent 8.062,1.558 8.44,2.244
3D body: height 0.7, standoff 0.5, extent 7.412,1.101 7.79,1.355
3D body: height 0.7, standoff 0, extent 7.412,1.355 7.79,1.558
3D body: height 0.2, standoff 0, extent 7.412,1.558 7.79,2.244
3D body: height 0.7, standoff 0.5, extent 6.762,1.101 7.14,1.355
3D body: height 0.7, standoff 0, extent 6.762,1.355 7.14,1.558
3D body: height 0.2, standoff 0, extent 6.762,1.558 7.14,2.244
3D body: height 0.7, standoff 0.5, extent 6.112,1.101 6.49,1.355
3D body: height 0.7, standoff 0, extent 6.112,1.355 6.49,1.558
3D body: height 0.2, standoff 0, extent 6.112,1.558 6.49,2.244
3D body: height 0.7, standoff 0.5, extent 5.462,1.101 5.84,1.355
3D body: height 0.7, standoff 0, extent 5.462,1.355 5.84,1.558
3D body: height 0.2, standoff 0, extent 5.462,1.558 5.84,2.244
3D body: height 0.7, standoff 0.5, extent 4.812,1.101 5.19,1.355
3D body: height 0.7, standoff 0, extent 4.812,1.355 5.19,1.558
3D body: height 0.2, standoff 0, extent 4.812,1.558 5.19,2.244
3D body: height 0.7, standoff 0.5, extent 4.162,1.101 4.54,1.355
3D body: height 0.7, standoff 0, extent 4.162,1.355 4.54,1.558
3D body: height 0.2, standoff 0, extent 4.162,1.558 4.54,2.244
3D body: height 0.7, standoff 0.5, extent 3.512,1.101 3.89,1.355
3D body: height 0.7, standoff 0, extent 3.512,1.355 3.89,1.558
3D body: height 0.2, standoff 0, extent 3.512,1.558 3.89,2.244
3D body: height 0.7, standoff 0.5, extent 2.862,1.101 3.24,1.355
3D body: height 0.7, standoff 0, extent 2.862,1.355 3.24,1.558
3D body: height 0.2, standoff 0, extent 2.862,1.558 3.24,2.244
3D body: height 0.7, standoff 0.5, extent 2.212,1.101 2.59,1.355
3D body: height 0.7, standoff 0, extent 2.212,1.355 2.59,1.558
3D body: height 0.2, standoff 0, extent 2.212,1.558 2.59,2.244
3D body: height 0.7, standoff 0.5, extent 1.562,1.101 1.94,1.355
3D body: height 0.7, standoff 0, extent 1.562,1.355 1.94,1.558
3D body: height 0.2, standoff 0, extent 1.562,1.558 1.94,2.244
3D body: height 1.2, standoff 0.1, extent 0.65,-8.9 10.65,1.1

## LTS 15-NP [mm]
pads (9):
  oval 3x1.8 hole 1.2: 1(0,0) 2(0,2.54) 3(0,5.08) 4(12.7,5.08) 5(12.7,2.54) 6(12.7,0)
  round 1.1 hole 0.65: 7(3.81,-7.62) 8(6.35,-7.62) 9(8.89,-7.62)
Top Overlay:
  lines w0.1: 2.4,-7.6 ccw(c3.3,-7.6) 3.3,-8.5 9.4,-8.5 ccw(c9.4,-7.6) 10.3,-7.6 10.3,11.44 ccw(c9.4,11.44) 9.4,12.34 3.3,12.34 ccw(c3.3,11.44) 2.4,11.44 2.4,-7.6
3D body: height 2, standoff -1.5, extent 12.3,4.58 13.1,5.58
3D body: height 9.3, standoff 8.5, extent 11.1,4.08 13.1,6.08
3D body: height 9.3, standoff 0.5, extent 12.3,4.08 13.1,6.08
3D body: height 2, standoff -1.5, extent 12.3,2.04 13.1,3.04
3D body: height 9.3, standoff 8.5, extent 11.1,1.54 13.1,3.54
3D body: height 9.3, standoff 0.5, extent 12.3,1.54 13.1,3.54
3D body: height 2, standoff -1.5, extent 12.3,-0.5 13.1,0.5
3D body: height 9.3, standoff 8.5, extent 11.1,-1 13.1,1
3D body: height 9.3, standoff 0.5, extent 12.3,-1 13.1,1
3D body: height 2, standoff -1.5, extent -0.4,4.58 0.4,5.58
3D body: height 9.3, standoff 8.5, extent -0.4,4.08 1.6,6.08
3D body: height 9.3, standoff 0.5, extent -0.4,4.08 0.4,6.08
3D body: height 2, standoff -1.5, extent -0.4,2.04 0.4,3.04
3D body: height 9.3, standoff 8.5, extent -0.4,1.54 1.6,3.54
3D body: height 9.3, standoff 0.5, extent -0.4,1.54 0.4,3.54
3D body: height 24, standoff 21, extent 1.6,-9.07 11.1,-6.082
3D body: height 12.5, standoff 0, extent 1.6,4.967 11.1,12.967
3D body: height 20.5, standoff 0, extent 1.6,-9.07 11.1,4.998
3D body: height 20.48, standoff 4.52, extent 1.6,-2.97 11.1,12.967
3D body: height 24, standoff 21, extent 1.6,-2.064 11.1,0.924
3D body: height 22.5, standoff 20.5, extent 1.6,-9.07 11.1,0.924
3D body: height 24, standoff 20.5, extent 1.6,-7.576 11.1,-0.57
3D body: height 14, standoff 11, extent 1.55,1.536 11.15,4.524
3D body: height 9.3, standoff 0.5, extent -0.4,-1 0.4,1
3D body: height 9.3, standoff 8.5, extent -0.4,-1 1.6,1
3D body: height 2, standoff -1.5, extent -0.4,-0.5 0.4,0.5

## M25P64 [mm] "Body 6mmX8mm"
height 1
pads (9):
  rect 1.3x0.6 smd: 1(0,0) 2(0,-1.27) 3(0,-2.54) 4(0,-3.81) 5(7.7,-3.81) 6(7.7,-2.54) 7(7.7,-1.27) 8(7.7,0)
  rect 3x3 smd: ""(3.85,-1.905)
Top Overlay:
  circle w0.254: c0.01,1.651 r0.284
  lines w0.127: -0.777,-4.905 8.477,-4.905 8.477,1.095 -0.777,1.095 -0.777,-4.905

## Magnetic31 [mm]
height 9
Top Overlay:
  lines w0.2: 2.535,10.395 cw(c0,0) -2.535,10.395 -2.536,14.835 ccw(c0,0) 2.536,14.835 2.54,10.414

## MB6M [mm]
pads (4):
  round 1.8 hole 0.9: 1(0,2.7) 2(0,0) 3(6,0) 4(6,2.7)
Top Overlay:
  lines w0.254: 1.15,-0.125 1.15,2.825 1.2,2.875 1.55,2.875 4.825,2.875 4.85,2.85 4.85,-0.15 4.825,-0.175 1.2,-0.175 1.15,-0.125

## MB6S [mm]
pads (4):
  rect 0.9x1.3 smd: 1(0,0) 2(2.5,0) 3(2.5,5.9) 4(0,5.9)
3D body: height 3.01, standoff 3, extent -0.594,1.402 0.004,2.001
3D body: height 0.2, standoff 0, extent -0.3,5.75 0.3,6.25
3D body: height 1.6, standoff 0, extent -0.3,5.55 0.3,5.75
3D body: height 1.6, standoff 1.4, extent -0.3,4.95 0.3,5.55
3D body: height 0.2, standoff 0, extent 2.2,5.75 2.8,6.25
3D body: height 1.6, standoff 0, extent 2.2,5.55 2.8,5.75
3D body: height 1.6, standoff 1.4, extent 2.2,4.95 2.8,5.55
3D body: height 0.2, standoff 0, extent 2.2,-0.35 2.8,0.15
3D body: height 1.6, standoff 0, extent 2.2,0.15 2.8,0.35
3D body: height 1.6, standoff 1.4, extent 2.2,0.35 2.8,0.95
3D body: height 3, standoff 0, extent -1.1,0.95 3.6,4.95
3D body: height 1.6, standoff 1.4, extent -0.3,0.35 0.3,0.95
3D body: height 1.6, standoff 0, extent -0.3,0.15 0.3,0.35
3D body: height 0.2, standoff 0, extent -0.3,-0.35 0.3,0.15

## MBMPC-7526 [mil]
pads (2):
  round 60 hole 30: 1(0,0) 2(200,0)
Top Overlay:
  lines w10: -47.64,-49.21 247.64,-49.21 247.64,49.21 -47.64,49.21 -47.64,-49.21

## MBMPC-7532 [mil]
pads (2):
  round 60 hole 30: 1(-100,0) 2(100,0)
Top Overlay:
  lines w10: -147.64,-62.99 147.64,-62.99 147.64,62.99 -147.64,62.99 -147.64,-62.99

## MBMPC-7550 [mil]
pads (2):
  round 60 hole 30: 1(-100,0) 2(100,0)
Top Overlay:
  lines w10: -147.64,-98.43 147.64,-98.43 147.64,98.43 -147.64,98.43 -147.64,-98.43

## MBMPC-7560 [mil]
pads (2):
  round 60 hole 30: 1(-100,0) 2(100,0)
Top Overlay:
  lines w10: -147.64,-118.11 -147.64,118.11 147.64,118.11 147.64,-118.11 -147.64,-118.11

## MCX5.08-H5 [mm]
pads (5):
  round 2 hole 1.2: 1(0,0)
  round 2.8 hole 1.7: 2(-2.54,-2.54) 3(2.54,-2.54) 4(2.54,2.54) 5(-2.54,2.54)
Top Overlay:
  lines w0.2: -3,-0.74 -3,0.74 ; -0.74,-3 0.74,-3 ; -0.74,3 0.74,3 ; 3,-0.74 3,0.74

## ML49 [mm]
height 7
pads (2):
  rect 5x1.5 smd: 1(0,0) 2(8.255,0)
3D body: height 1, standoff 0.2, extent -1.623,1.1 -0.423,2.3
3D body: height 1, standoff 0.2, extent 8.677,1.1 9.877,2.3
3D body: height 1, standoff 0.2, extent 8.677,-2.3 9.877,-1.1
3D body: height 1, standoff 0.2, extent -1.623,-2.3 -0.423,-1.1
3D body: height 0.3, standoff 0, extent 5.9,-0.3 10.4,0.5
3D body: height 0.3, standoff 0, extent -2.073,-0.4 2.427,0.4
3D body: height 4, standoff 0.2, extent -1.272,-2.1 9.527,2.1
3D body: height 1.2, standoff 0.6, extent -1.623,-2.3 9.877,2.3
3D body: height 0.6, standoff 0, extent -1.623,-2.3 9.877,2.3

## MOSFET POWER MODULE B1 [mm]
Top Overlay:
  circle w0.254: c4.9,4.7 r2.1
  circle w0.254: c4.9,61.3 r2.1
  circle w0.254: c37.8,6.5 r2.1
  circle w0.254: c37.8,58 r2.1
  circle w0.254: c20.4,32.8 r2.1
  circle w0.254: c55.2,32.8 r2.1
  circle w0.254: c90,32.8 r2.1
  circle w0.254: c105.1,4.7 r2.1
  circle w0.254: c105.1,61.3 r2.1
  lines w0.2: 0,0 110,0 110,66 0,66 0,0